# Altium footprint library TarabusLib_KAP.PcbLib: 504 footprints (part 22 of 32)
Each footprint in its own frame and in the unit in brackets; x right, y up, seen from the top. Pads: shape width x height; smd on the part's side, far side on the other; paste and mask are expansions set on the pad; w line width, h text height; cw(c..) or ccw(c..) is an arc to the next point about the centre after c.
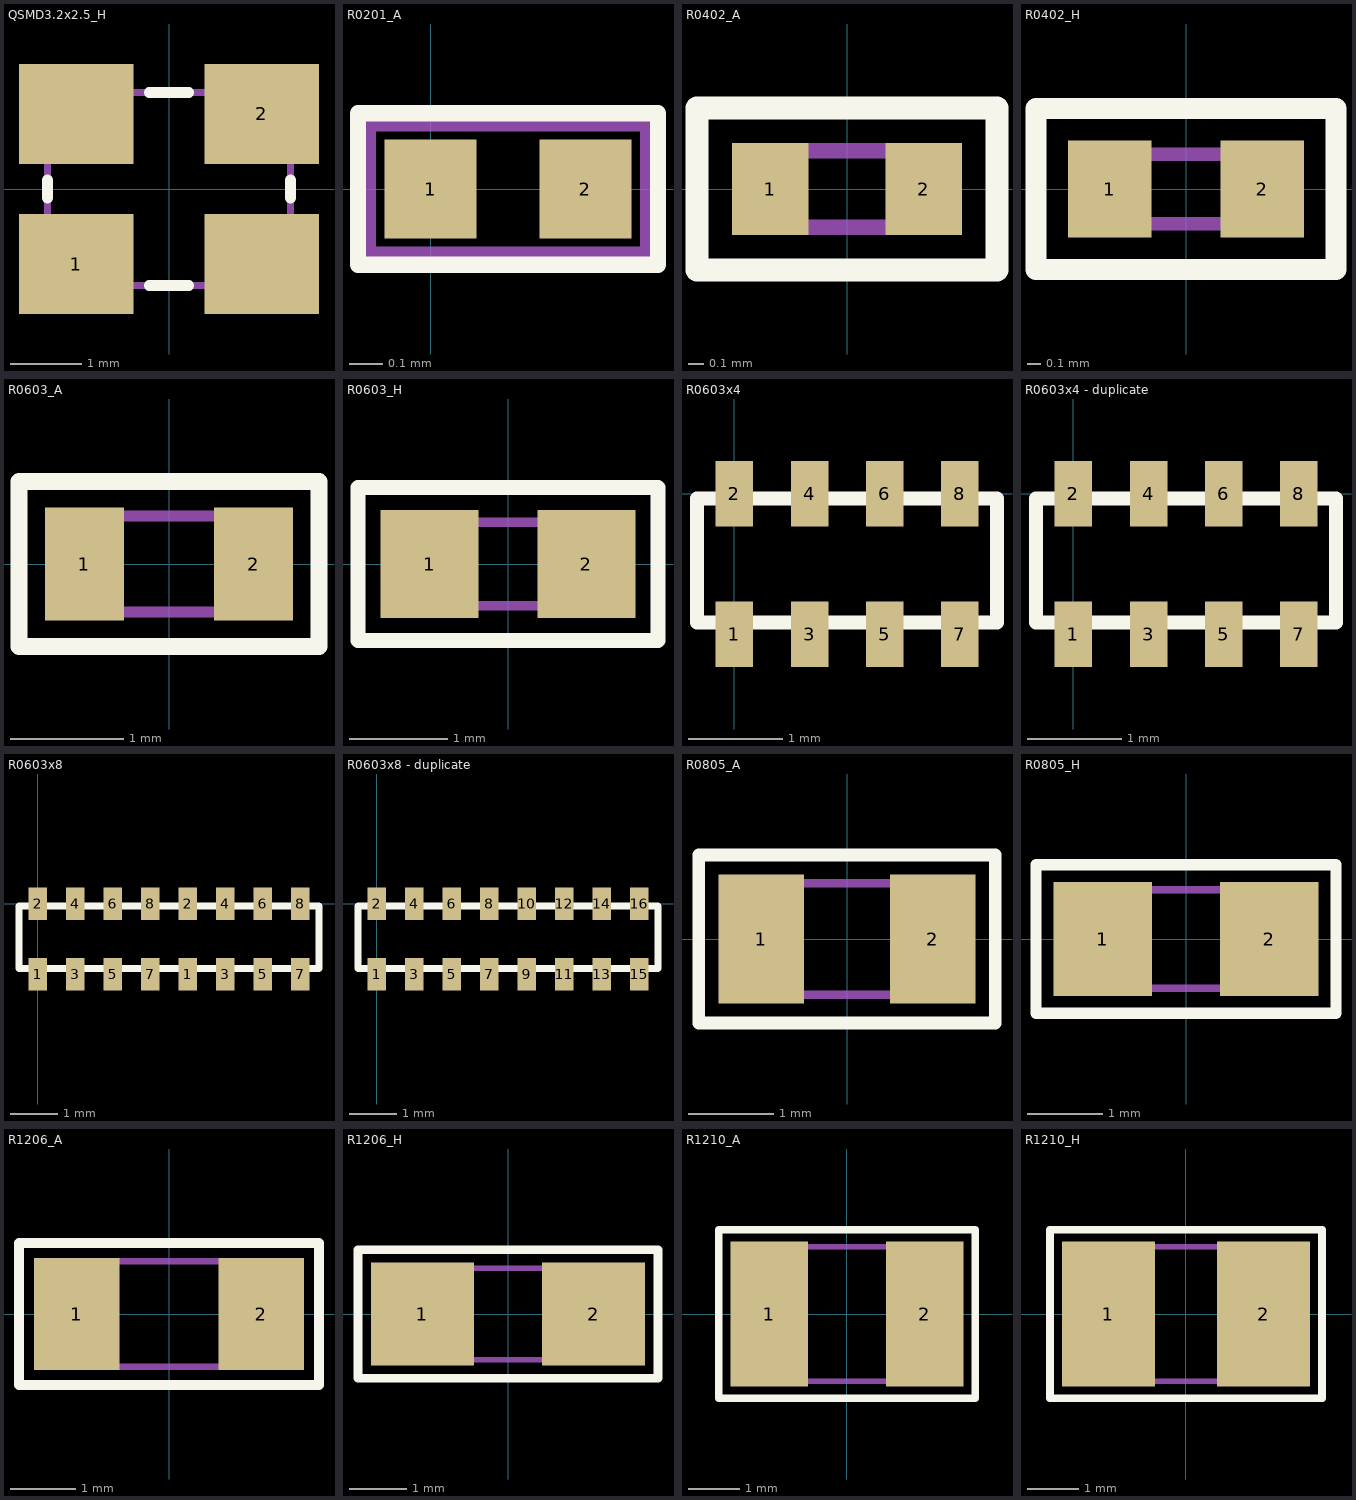
[diagram p21: the footprints below, top view; thin cyan lines are the x and y axes]

## QSMD3.2x2.5_H [mm]
height 1.2
pads (4):
  rect 1.6x1.4 smd: 1(-1.3,-1.05) 2(1.3,1.05) ""(-1.3,1.05) ""(1.3,-1.05)
Top Overlay:
  lines w0.15: -1.7,-0.125 -1.7,0.125 ; -0.275,-1.35 0.275,-1.35 ; -0.275,1.35 0.275,1.35 ; 1.7,-0.125 1.7,0.125
Mechanical 7:
  lines w0.1: -1.7,-1.35 -1.7,1.35 1.7,1.35 1.7,-1.35 -1.7,-1.35
Mechanical 10:
  text ".Designator" at -0.825,2.75 h0.8
  text ".Comment" at -0.8,2.175 h0.6
3D body: height 1.2, standoff 0, extent -1.7,-1.35 1.7,1.35

## R0201_A [mm]
pads (2):
  rect 0.28x0.3 smd mask+0.05: 1(0,0) 2(0.47,0)
Top Overlay:
  lines w0.05: -0.22,-0.23 0.69,-0.23 0.69,0.23 -0.22,0.23 -0.22,-0.23
Mechanical 7:
  lines w0.05: -0.19,-0.2 -0.19,0.2 0.66,0.2 0.66,-0.2 -0.19,-0.2
Mechanical 10:
  text ".Designator" at -0.08,0.73 h0.8
  text ".Comment" at -0.08,-1.13 h0.6
3D body: height 0.23, standoff 0, extent -0.06,-0.15 0.53,0.15

## R0402_A [mm]
height 0.35
pads (2):
  rect 0.5x0.6 smd: 1(-0.5,0) 2(0.5,0)
Top Overlay:
  lines w0.15: -0.98,-0.53 -0.98,0.53 0.98,0.53 0.98,-0.53 -0.98,-0.53
Mechanical 7:
  lines w0.1: -0.5,-0.25 0.5,-0.25 0.5,0.25 -0.5,0.25 -0.5,-0.25
Mechanical 10:
  text ".Designator" at -0.58,0.75 h0.8
  text ".Comment" at -0.58,-1.11 h0.6
3D body: height 0.35, standoff 0, extent -0.5,-0.25 0.5,0.25

## R0402_H [mm]
height 0.35
pads (2):
  rect 0.6x0.7 smd: 1(-0.55,0) 2(0.55,0)
Top Overlay:
  lines w0.15: -1.08,-0.58 1.08,-0.58 1.08,0.58 -1.08,0.58 -1.08,-0.58
Mechanical 7:
  lines w0.1: -0.5,-0.25 -0.5,0.25 0.5,0.25 0.5,-0.25 -0.5,-0.25
Mechanical 10:
  text ".Comment" at -0.65,-1.15 h0.6
  text ".Designator" at -0.58,0.75 h0.8
3D body: height 0.35, standoff 0, extent -0.5,-0.25 0.5,0.25

## R0603_A [mm]
height 0.54
pads (2):
  rect 0.7x1 smd: 1(-0.75,0) 2(0.75,0)
Top Overlay:
  lines w0.15: -1.33,-0.73 1.33,-0.73 1.33,0.73 -1.33,0.73 -1.33,-0.73
Mechanical 7:
  lines w0.1: -0.8,-0.425 -0.8,0.425 0.8,0.425 0.8,-0.425 -0.8,-0.425
Mechanical 10:
  text ".Designator" at -0.62,1 h0.8
  text ".Comment" at -0.69,-1.29 h0.6
3D body "RESC1608.STEP": height 0.5, standoff 0, extent -0.85,-0.4 0.75,0.4

## R0603_H [mm]
height 0.45
pads (2):
  rect 1x1.1 smd: 1(-0.8,0) 2(0.8,0)
Top Overlay:
  lines w0.15: -1.53,-0.78 -1.53,0.78 1.53,0.78 1.53,-0.78 -1.53,-0.78
Mechanical 7:
  lines w0.1: -0.8,-0.425 0.8,-0.425 0.8,0.425 -0.8,0.425 -0.8,-0.425
Mechanical 10:
  text ".Designator" at -0.62,1 h0.8
  text ".Comment" at -0.78,-1.36 h0.6
3D body: height 0.45, standoff 0, extent -0.8,-0.425 0.8,0.425

## R0603x4 [mm]
height 0.55
pads (8):
  rect 0.4x0.7 smd: 1(0,-1.5) 2(0,0) 3(0.8,-1.5) 4(0.8,0) 5(1.6,-1.5) 6(1.6,0) 7(2.4,-1.5) 8(2.4,0)
Top Overlay:
  lines w0.15: -0.4,-1.375 -0.4,-0.05 2.8,-0.05 2.8,-1.375 -0.4,-1.375
Mechanical 7:
  lines w0.1: -0.4,-1.375 2.8,-1.375 2.8,-0.05 -0.4,-0.05 -0.4,-1.375
Mechanical 10:
  text ".Designator" at -0.58,0.75 h0.8
  text ".Comment" at -0.56,-1.1 h0.6
3D body: height 0.55, standoff 0, extent -0.4,-1.375 2.825,-0.05

## R0603x4 - duplicate [mm]
height 0.55
pads (8):
  rect 0.4x0.7 smd: 1(0,-1.5) 2(0,0) 3(0.8,-1.5) 4(0.8,0) 5(1.6,-1.5) 6(1.6,0) 7(2.4,-1.5) 8(2.4,0)
Top Overlay:
  lines w0.15: -0.4,-1.375 2.8,-1.375 2.8,-0.05 -0.4,-0.05 -0.4,-1.375
Mechanical 7:
  lines w0.1: -0.4,-1.375 -0.4,-0.05 2.8,-0.05 2.8,-1.375 -0.4,-1.375
Mechanical 10:
  text ".Comment" at -0.56,-1.1 h0.6
  text ".Designator" at -0.58,0.75 h0.8
3D body: height 0.55, standoff 0, extent -0.4,-1.375 2.825,-0.05

## R0603x8 [mm]
height 0.55
pads (16):
  rect 0.4x0.7 smd: 1(0,-1.5) 1(3.2,-1.5) 2(0,0) 2(3.2,0) 3(0.8,-1.5) 3(4,-1.5) 4(0.8,0) 4(4,0) 5(1.6,-1.5) 5(4.8,-1.5) 6(1.6,0) 6(4.8,0) 7(2.4,-1.5) 7(5.6,-1.5) 8(2.4,0) 8(5.6,0)
Top Overlay:
  lines w0.15: -0.4,-1.375 -0.4,-0.05 6,-0.05 6,-1.375 -0.4,-1.375
Mechanical 7:
  lines w0.1: -0.4,-1.375 6,-1.375 6,-0.05 -0.4,-0.05 -0.4,-1.375
Mechanical 10:
  text ".Designator" at -0.58,0.75 h0.8
  text ".Comment" at -0.56,-1.1 h0.6
3D body: height 0.55, standoff 0, extent -0.4,-1.375 6,-0.05

## R0603x8 - duplicate [mm]
height 0.55
pads (16):
  rect 0.4x0.7 smd: 1(0,-1.5) 2(0,0) 3(0.8,-1.5) 4(0.8,0) 5(1.6,-1.5) 6(1.6,0) 7(2.4,-1.5) 8(2.4,0) 9(3.2,-1.5) 10(3.2,0) 11(4,-1.5) 12(4,0) 13(4.8,-1.5) 14(4.8,0) 15(5.6,-1.5) 16(5.6,0)
Top Overlay:
  lines w0.15: -0.4,-1.375 6,-1.375 6,-0.05 -0.4,-0.05 -0.4,-1.375
Mechanical 7:
  lines w0.1: -0.4,-1.375 -0.4,-0.05 6,-0.05 6,-1.375 -0.4,-1.375
Mechanical 10:
  text ".Comment" at -0.56,-1.1 h0.6
  text ".Designator" at -0.58,0.75 h0.8
3D body: height 0.55, standoff 0, extent -0.4,-1.375 6,-0.05

## R0805_A [mm]
height 0.5
pads (2):
  rect 1x1.5 smd: 1(-1,0) 2(1,0)
Top Overlay:
  lines w0.15: -1.73,-0.98 -1.73,0.98 1.73,0.98 1.73,-0.98 -1.73,-0.98
Mechanical 7:
  lines w0.1: -1.05,-0.65 1.05,-0.65 1.05,0.65 -1.05,0.65 -1.05,-0.65
Mechanical 10:
  text ".Comment" at -0.56,-1.62 h0.6
  text ".Designator" at -0.47,1.37 h0.8
3D body: height 0.5, standoff 0, extent -1.05,-0.65 1.05,0.65

## R0805_H [mm]
height 0.5
pads (2):
  rect 1.3x1.5 smd: 1(-1.1,0) 2(1.1,0)
Top Overlay:
  lines w0.15: -1.98,-0.98 -1.98,0.98 1.98,0.98 1.98,-0.98 -1.98,-0.98
Mechanical 7:
  lines w0.1: -1.05,-0.65 -1.05,0.65 1.05,0.65 1.05,-0.65 -1.05,-0.65
Mechanical 10:
  text ".Designator" at -0.47,1.37 h0.8
  text ".Comment" at -0.64,-1.56 h0.6
3D body: height 0.5, standoff 0, extent -1.05,-0.65 1.05,0.65

## R1206_A [mm]
height 0.55
pads (2):
  rect 1.3x1.7 smd: 1(-1.4,0) 2(1.4,0)
Top Overlay:
  lines w0.15: -2.28,-1.08 -2.28,1.08 2.28,1.08 2.28,-1.08 -2.28,-1.08
Mechanical 7:
  lines w0.1: -1.55,-0.8 1.55,-0.8 1.55,0.8 -1.55,0.8 -1.55,-0.8
Mechanical 10:
  text ".Designator" at -0.55,1.31 h0.8
  text ".Comment" at -0.58,-1.69 h0.6
3D body: height 0.55, standoff 0, extent -1.55,-0.8 1.55,0.8

## R1206_H [mm]
height 0.55
pads (2):
  rect 1.8x1.8 smd: 1(-1.5,0) 2(1.5,0)
Top Overlay:
  lines w0.15: -2.63,-1.13 2.63,-1.13 2.63,1.13 -2.63,1.13 -2.63,-1.13
Mechanical 7:
  lines w0.1: -1.55,-0.8 1.55,-0.8 1.55,0.8 -1.55,0.8 -1.55,-0.8
Mechanical 10:
  text ".Comment" at -0.58,-1.75 h0.6
  text ".Designator" at -0.55,1.31 h0.8
3D body: height 0.55, standoff 0, extent -1.55,-0.8 1.55,0.8

## R1210_A [mm]
height 0.55
pads (2):
  rect 1.5x2.8 smd: 1(-1.5,0) 2(1.5,0)
Top Overlay:
  lines w0.15: -2.48,-1.63 -2.48,1.63 2.48,1.63 2.48,-1.63 -2.48,-1.63
Mechanical 7:
  lines w0.1: -1.55,-1.3 1.55,-1.3 1.55,1.3 -1.55,1.3 -1.55,-1.3
Mechanical 10:
  text ".Comment" at -0.76,-2.28 h0.6
  text ".Designator" at -0.71,1.89 h0.8
3D body: height 0.55, standoff 0, extent -1.55,-1.3 1.55,1.3

## R1210_H [mm]
height 0.55
pads (2):
  rect 1.8x2.8 smd: 1(-1.5,0) 2(1.5,0)
Top Overlay:
  lines w0.15: -2.63,-1.63 2.63,-1.63 2.63,1.63 -2.63,1.63 -2.63,-1.63
Mechanical 7:
  lines w0.1: -1.55,-1.3 1.55,-1.3 1.55,1.3 -1.55,1.3 -1.55,-1.3
Mechanical 10:
  text ".Designator" at -0.71,1.89 h0.8
  text ".Comment" at -0.81,-2.25 h0.6
3D body: height 0.55, standoff 0, extent -1.55,-1.3 1.55,1.3